# Altium integrated library SJ Sockets & Connectors.IntLib: 179 symbols (part 1 of 2)
Pins are listed as number, name and electrical type; pins without a type are passive.

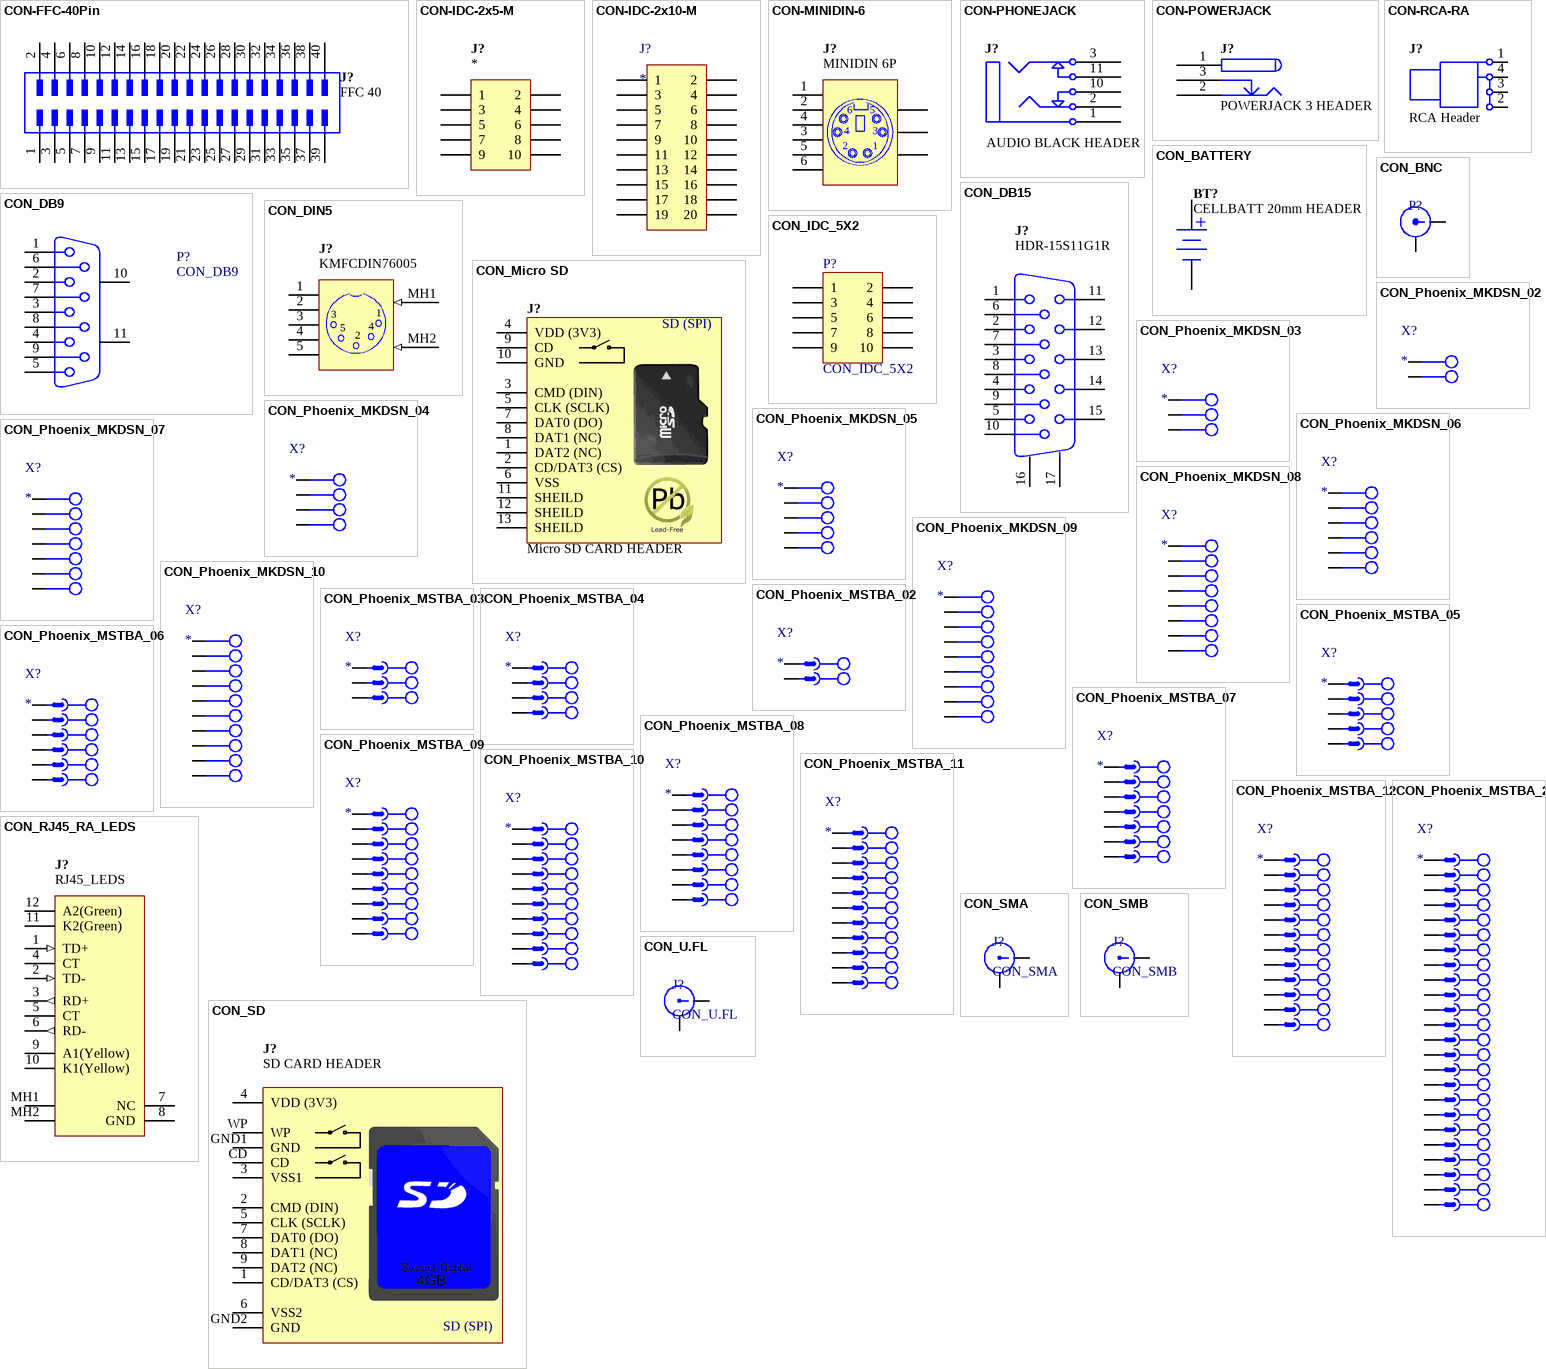
[diagram p0: symbols CON-FFC-40Pin to CON_U.FL]

## CON-FFC-40Pin
designator J?, comment FFC 40
Header FFC, 40 pin; Connector type: Straight; Max Current: mA; designer: Eng. Saeid Jorablo; Company: SJ Libraries; Mounting Technology: Surface Mount; Pin Count: 40; Status: Unreleased; Category: Connector; Publisher: SJ UnLimited; ComponentLink1Description: Datasheet; ComponentLink2Description: Reference; Update: 7/8/2012; HelpURL: http://s3.picofile.com/file/7443264187/Coming_Soon_logo.gif
footprint SMD_CON_FPC_2x20 (FPC-XXS1VN3R)
signal-integrity model Connector (40 Pin FFC Connector)
footprint FFC/SM0.5-2H40A (Connector; FH12 Series; 40 Position; 0.5mm Spaced Top Contact)
pins: 1, 2, 3, 4, 5, 6, 7, 8, 9, 10, 11, 12, 13, 14, 15, 16, 17, 18, 19, 20, 21, 22, 23, 24, 25, 26, 27, 28, 29, 30, 31, 32, 33, 34, 35, 36, 37, 38, 39, 40

## CON-IDC-2x5-M
designator J?
IDC, 2 X 5 Pin - Male; Connector type: Boxed; Max Current: mA; designer: Eng. Saeid Jorablo; Company: SJ Libraries; Category: Connector; Mounting Technology: Surface Mount; Pin Count: 10; Status: Unreleased; Publisher: SJ UnLimited; ComponentLink1Description: Datasheet; ComponentLink2Description: Reference; Update: 7/8/2012; HelpURL: http://s3.picofile.com/file/7443264187/Coming_Soon_logo.gif
footprint SMD_CON_IDC_2x5
signal-integrity model Connector (10 Pin IDC Connector)
footprint IDC2.54-V10D (Connector; IDC, Low Profile Male Header, Thru-Hole; 10 Position; Vertical; Pitch 2.54 mm; Body 20.32 x 9.2 x 9.45 mm (LxWxH))
footprint IDC2.54-H10C (Connector; IDC, Low Profile Male Header, Thru-Hole; 10 Position; Right Angle; Pitch 2.54 mm; Body 20.32 x 8.9 x 9.2 mm (LxWxH))
pins: 1, 2, 3, 4, 5, 6, 7, 8, 9, 10

## CON-IDC-2x10-M
designator J?
IDC, 2 X 10 Pin - Male; designer: Eng. Saeid Jorablo; Company: SJ Libraries; Max Current: mA; Mounting Technology: Through-Hole; Category: Connector; Pin Count: 20; Publisher: SJ UnLimited; Status: Unreleased; ComponentLink1Description: Datasheet; ComponentLink2Description: Reference; Update: 7/8/2012; HelpURL: http://s3.picofile.com/file/7443264187/Coming_Soon_logo.gif
footprint IDC2.54-H20C (Connector; IDC, Low Profile Male Header, Thru-Hole; 20 Position; Right Angle; Pitch 2.54 mm; Body 33.02 x 8.9 x 9.2 mm (LxWxH))
footprint IDC2.54-V20D (Connector; IDC, Low Profile Male Header, Thru-Hole; 20 Position; Vertical; Pitch 2.54 mm; Body 33.02 x 9.2 x 9.45 mm (LxWxH))
signal-integrity model Connector (20 Pin IDC Connector)
pins: 1, 2, 3, 4, 5, 6, 7, 8, 9, 10, 11, 12, 13, 14, 15, 16, 17, 18, 19, 20

## CON-MINIDIN-6
designator J?, comment MINIDIN 6P
MINI DIN R/A F/SHLD 6P GOLD PLATED; Black; Connector type: Right Angle; Max Current: 2A; designer: Eng. Saeid Jorablo; Company: SJ Libraries; Mounting Technology: Through-Hole; Pin Count: 6; Status: Unreleased; Category: Connector; Publisher: SJ UnLimited; ComponentLink1Description: Datasheet; ComponentLink2Description: Reference; Update: 7/8/2012; HelpURL: http://s3.picofile.com/file/7443264187/Coming_Soon_logo.gif
footprint DIP_CON_MINIDIN6_Keyboard (Footprint not found)
footprint DIP_CON_MINIDIN6_MOUSE
signal-integrity model Connector (mini DIN Connector)
pins: 1, 2, 3, 4, 5, 6, MH1 "Mounting Fixture", MH2 "Mounting Fixture", MH3 "Mounting Fixture"

## CON-PHONEJACK
designator J?, comment AUDIO BLACK HEADER
Connector, 3.5mm Stereo Audio Socket, Black, 2 break contacts (normals) and 2 auxiliary make contacts; Max Current: mA; designer: Eng. Saeid Jorablo; Company: SJ Libraries; Category: Connector; Connector type: AUDIO BLACK HEADER; Mounting Technology: Through-Hole; Pin Count: 5; Status: Unreleased; Publisher: SJ UnLimited; ComponentLink1Description: Datasheet; ComponentLink2Description: Reference; Update: 7/8/2012; HelpURL: http://s3.picofile.com/file/7443264187/Coming_Soon_logo.gif
footprint DIP_CON_TSH_3675_Headphone
footprint DIP_CON_TSH_3675_Line In
footprint DIP_CON_TSH_3675_Line Out
signal-integrity model Connector (Phone Jack Connector)
pins: 1, 2, 3, 10, 11
3 alternate drawings of the same symbol

## CON-POWERJACK
designator J?, comment POWERJACK 3 HEADER
Connector, 3 Conductor Power Jack 2 break 2 aux contacts; Max Current: mA; designer: Eng. Saeid Jorablo; Company: SJ Libraries; Category: Connector; Connector type: POWERJACK 3 HEADER; Mounting Technology: Through-Hole; Pin Count: 3; Status: Unreleased; Publisher: SJ UnLimited; ComponentLink1Description: Datasheet; ComponentLink2Description: Reference; Update: 7/8/2012; HelpURL: http://s3.picofile.com/file/7443264187/Coming_Soon_logo.gif
footprint DIP_CON_POWER JACK (Power Adaptor Jack)
signal-integrity model Connector (Power Jack Connector)
footprint DC Power Jack DS213 (DC Power Jack Model DS-213)
pins: 1 Core (power), 2 Shield (power), 3 Detect (power)
2 alternate drawings of the same symbol

## CON-RCA-RA
designator J?, comment RCA Header
Connector, TRC-005-4 , Black RCA Phono Jack, Right Angle, Thru-Hole, Snap-In; Max Current: mA; designer: Eng. Saeid Jorablo; Company: SJ Libraries; Connector type: Header; Mounting Technology: Through-Hole; Pin Count: 4; Status: Unreleased; Category: Connector; Publisher: SJ Limited; Update Date: 27-May-2012; Publisher: SJ UnLimited; ComponentLink1Description: Datasheet; ComponentLink2Description: Reference; Update: 7/8/2012; HelpURL: http://s3.picofile.com/file/7443264187/Coming_Soon_logo.gif
footprint DIP_CON_TRC
signal-integrity model Connector (RCA Connector)
pins: 1 Black, 2 Yellow, 3 White, 4 Red

## CON_BATTERY
designator BT?, comment CELLBATT 20mm HEADER
Lithium Battery Holder for CR2032 3V Cell; designer: Eng. Saeid Jorablo; Company: SJ Libraries; Max Current: mA; Category: Connector; Mounting Technology: Surface Mount\Through-Hole; Status: Unreleased; Pin Count: 2; Publisher: SJ UnLimited; ComponentLink1Description: Datasheet; ComponentLink2Description: Reference; Update: 7/8/2012; HelpURL: http://s3.picofile.com/file/7443264187/Coming_Soon_logo.gif
footprint CELL_HOLDER2
footprint cell_holder
footprint SMD_CELL_HOLDER
signal-integrity model Connector (Cell Holder Connector)
footprint SMD_CELL_HOLDER_BC501SM-TR (BC501SM-TR Battery Holder (For CR1220 Cells))
pins: 1 + (power), 2 - (power)
1 alternate drawing of the same symbol

## CON_BNC
designator P?
BNC Socket, PCB Mounted; designer: Eng. Saeid Jorablo; Company: SJ Libraries; Max Current: mA; Mounting Technology: Through-Hole; Category: Connector; Pin Count: 2; Publisher: SJ UnLimited; Status: Unreleased; ComponentLink1Description: Datasheet; ComponentLink2Description: Reference; Update: 7/8/2012; HelpURL: http://s3.picofile.com/file/7443264187/Coming_Soon_logo.gif
footprint BNC - Connector
footprint BNC - Complex
signal-integrity model Connector (BNC Connector)
pins: 1, 2

## CON_DB9
designator P?
Receptacle Assembly, 9 Position, Right Angle; Positions: 9; designer: Eng. Saeid Jorablo; Company: SJ Libraries; Max Current: mA; LatestRevisionDate: 17-Jul-2002; Publisher: SJ UnLimited; Orientation: Right Angle; Mounting Technology: Through-Hole; Category: Connector; Pin Count: 9; Status: Unreleased; ComponentLink1Description: Datasheet; ComponentLink2Description: Reference; Update: 7/8/2012; HelpURL: http://s3.picofile.com/file/7443264187/Coming_Soon_logo.gif
footprint DB9 Female (Connector; D Subminiature AMPLIMITE 2000; 9 Position; Right Angle)
footprint DB9 Male (Connector; D Subminiature AMPLIMITE 2000; 9 Position; Right Angle)
signal-integrity model Connector (DB9 Connector)
pins: 1 (Data Carrier Detect) DCD, 2 (Receive Data) RxD, 3 (Trasmit Data) TxD, 4 (Data Terminal Ready) DTR, 5 (Signal Ground) GND, 6 (Data Set Ready) DSR, 7 (Request To Send) RTS, 8 (Clear To Send) CTS, 9 (Ring Indicator) RI, 10, 11
2 alternate drawings of the same symbol

## CON_DB15
designator J?, comment HDR-15S11G1R
Socket, High-Density DB15 (HD15) R/A Female Through-hole; Connector type: Right Angle; Max Current: 3 A; designer: Eng. Saeid Jorablo; Company: SJ Libraries; Category: Connector; Mounting Technology: Through-Hole; Pin Count: 15; Status: Unreleased; Publisher: SJ UnLimited; ComponentLink1Description: Datasheet; ComponentLink2Description: Reference; Update: 7/8/2012; HelpURL: http://s3.picofile.com/file/7443264187/Coming_Soon_logo.gif
footprint DIP_CON_DB15_FEMALE
signal-integrity model Connector (DB15 Connector)
pins: 1 "Red Video", 2 "Green Video", 3 "Blue Video", 4 "Monitor ID Bit 2 (Ground)", 5 (power) "Ground", 6 (power) "Red Return (Ground)", 7 (power) "Green Return (Ground)", 8 (power) "Blue Return (Ground)", 9 "Key (not used)", 10 (power) "Sync Return (Ground)", 11 (power) "Monitor ID Bit 0 (Ground)", 12 "Monitor ID Bit 1 (Not Used)", 13 "Horizontal Zync", 14 "Vertical Sync", 15 "Vertical Sync", 16 MH1 "shield", 17 MH2 "shield"

## CON_DIN5
designator J?, comment KMFCDIN76005
Socket, 5-way R/A DIN; Connector type: Right Angle; Max Current: mA; designer: Eng. Saeid Jorablo; Company: SJ Libraries; Mounting Technology: Through-Hole; Pin Count: 5; Status: Unreleased; Category: Connector; Publisher: SJ UnLimited; ComponentLink1Description: Datasheet; ComponentLink2Description: Reference; Update: 7/8/2012; HelpURL: http://s3.picofile.com/file/7443264187/Coming_Soon_logo.gif
footprint DIP_CON_DIN5 (KMFCDIN76005)
signal-integrity model Connector (DIN Connector)
pins: 1, 2, 3, 4, 5, MH1 (in), MH2 (in)

## CON_IDC_5X2
designator P?
Header, 5-Pin, Dual row; designer: Eng. Saeid Jorablo; Company: SJ Libraries; Max Current: mA; LatestRevisionDate: 17-Jul-2002; Publisher: SJ UnLimited; Mounting Technology: Through-Hole; Category: Connector; Pin Count: 10; Status: Unreleased; ComponentLink1Description: Datasheet; ComponentLink2Description: Reference; Update: 7/8/2012; HelpURL: http://s3.picofile.com/file/7443264187/Coming_Soon_logo.gif
signal-integrity model Connector (10 Pin IDC Connector)
footprint IDC2.54-V10D (Connector; IDC, Low Profile Male Header, Thru-Hole; 10 Position; Vertical; Pitch 2.54 mm; Body 20.32 x 9.2 x 9.45 mm (LxWxH))
footprint IDC2.54-H10C (Connector; IDC, Low Profile Male Header, Thru-Hole; 10 Position; Right Angle; Pitch 2.54 mm; Body 20.32 x 8.9 x 9.2 mm (LxWxH))
pins: 1, 2, 3, 4, 5, 6, 7, 8, 9, 10

## CON_Micro SD
designator J?, comment Micro SD CARD HEADER
Secure Digital Card Socket; Max Current: mA; designer: Eng. Saeid Jorablo; Company: SJ Libraries; Connector type: Header; Mounting Technology: Surface Mount; Status: Unreleased; Category: Connector; Pin Count: 13; Publisher: SJ UnLimited; ComponentLink1Description: Datasheet; ComponentLink2Description: Reference; Update: 7/8/2012; HelpURL: http://s3.picofile.com/file/7443264187/Coming_Soon_logo.gif
signal-integrity model Connector (SD Card Connector)
footprint SMD_CON_Micro SD -Push-Push (Micro SD Socket, Push Push Type (Product Number:112J-TXAR-R ))
footprint Micro SD (MicroSD Socket (Molex 500873-080X) (3M 2908-05WB-MG))
pins: 1 DAT2 (NC), 2 CD/DAT3 (CS), 3 CMD (DIN), 4 VDD (3V3) (power), 5 CLK (SCLK), 6 VSS (power), 7 DAT0 (DO), 8 DAT1 (NC), 9 CD, 10 GND (power), 11 SHEILD (power), 12 SHEILD (power), 13 SHEILD (power)
text: SD (SPI)

## CON_Phoenix_MKDSN_02
designator X?
Manufacturer: PHOENIX CONTACT; Company: SJ Libraries; Connector type: PCB Terminal Block; designer: Eng. Saeid Jorablo; Max Current: 13.5 A; Positions: 2; Revision 1: 2012/10/1 : Adding Model; Voltage: 400 V; Category: Connector; ComponentLink1Description: Datasheet; ComponentLink2Description: Reference; HelpURL: http://s3.picofile.com/file/7443264187/Coming_Soon_logo.gif; Mounting Technology: Through-Hole; Pin Count: 2; Publisher: SJ UnLimited; Status: Unreleased; Update: 2012/10/1
footprint CON_MKDSN1,5/2-5,08
pins: 1, 2

## CON_Phoenix_MKDSN_03
designator X?
Manufacturer: PHOENIX CONTACT; Company: SJ Libraries; Connector type: PCB Terminal Block; designer: Eng. Saeid Jorablo; Max Current: 13.5 A; Positions: 3; Revision 1: 2012/10/1 : Adding Model; Voltage: 400 V; Category: Connector; ComponentLink1Description: Datasheet; ComponentLink2Description: Reference; HelpURL: http://s3.picofile.com/file/7443264187/Coming_Soon_logo.gif; Mounting Technology: Through-Hole; Pin Count: 3; Publisher: SJ UnLimited; Status: Unreleased; Update: 2012/10/1
footprint CON_MKDSN1,5/3-5,08
pins: 1, 2, 3

## CON_Phoenix_MKDSN_04
designator X?
Manufacturer: PHOENIX CONTACT; Company: SJ Libraries; Connector type: PCB Terminal Block; designer: Eng. Saeid Jorablo; Max Current: 13.5 A; Positions: 4; Revision 1: 2012/10/1 : Adding Model; Voltage: 400 V; Category: Connector; ComponentLink1Description: Datasheet; ComponentLink2Description: Reference; HelpURL: http://s3.picofile.com/file/7443264187/Coming_Soon_logo.gif; Mounting Technology: Through-Hole; Pin Count: 4; Publisher: SJ UnLimited; Status: Unreleased; Update: 2012/10/1
footprint CON_MKDSN1,5/4-5,08
pins: 1, 2, 3, 4

## CON_Phoenix_MKDSN_05
designator X?
Manufacturer: PHOENIX CONTACT; Company: SJ Libraries; Connector type: PCB Terminal Block; designer: Eng. Saeid Jorablo; Max Current: 13.5 A; Positions: 5; Revision 1: 2012/10/1 : Adding Model; Voltage: 400 V; Category: Connector; ComponentLink1Description: Datasheet; ComponentLink2Description: Reference; HelpURL: http://s3.picofile.com/file/7443264187/Coming_Soon_logo.gif; Mounting Technology: Through-Hole; Pin Count: 5; Publisher: SJ UnLimited; Status: Unreleased; Update: 2012/10/1
footprint CON_MKDSN1,5/5-5,08
pins: 1, 2, 3, 4, 5

## CON_Phoenix_MKDSN_06
designator X?
Manufacturer: PHOENIX CONTACT; Company: SJ Libraries; Connector type: PCB Terminal Block; designer: Eng. Saeid Jorablo; Max Current: 13.5 A; Positions: 6; Revision 1: 2012/10/1 : Adding Model; Voltage: 400 V; Category: Connector; ComponentLink1Description: Datasheet; ComponentLink2Description: Reference; HelpURL: http://s3.picofile.com/file/7443264187/Coming_Soon_logo.gif; Mounting Technology: Through-Hole; Pin Count: 6; Publisher: SJ UnLimited; Status: Unreleased; Update: 2012/10/1
footprint CON_MKDSN1,5/6-5,08
pins: 1, 2, 3, 4, 5, 6

## CON_Phoenix_MKDSN_07
designator X?
Manufacturer: PHOENIX CONTACT; Company: SJ Libraries; Connector type: PCB Terminal Block; designer: Eng. Saeid Jorablo; Max Current: 13.5 A; Positions: 7; Revision 1: 2012/10/1 : Adding Model; Voltage: 400 V; Category: Connector; ComponentLink1Description: Datasheet; ComponentLink2Description: Reference; HelpURL: http://s3.picofile.com/file/7443264187/Coming_Soon_logo.gif; Mounting Technology: Through-Hole; Pin Count: 7; Publisher: SJ UnLimited; Status: Unreleased; Update: 2012/10/1
footprint CON_MKDSN1,5/7-5,08
pins: 1, 2, 3, 4, 5, 6, 7

## CON_Phoenix_MKDSN_08
designator X?
Manufacturer: PHOENIX CONTACT; Company: SJ Libraries; Connector type: PCB Terminal Block; designer: Eng. Saeid Jorablo; Max Current: 13.5 A; Positions: 8; Revision 1: 2012/10/1 : Adding Model; Voltage: 400 V; Category: Connector; ComponentLink1Description: Datasheet; ComponentLink2Description: Reference; HelpURL: http://s3.picofile.com/file/7443264187/Coming_Soon_logo.gif; Mounting Technology: Through-Hole; Pin Count: 8; Publisher: SJ UnLimited; Status: Unreleased; Update: 2012/10/1
footprint CON_MKDSN1,5/8-5,08
pins: 1, 2, 3, 4, 5, 6, 7, 8

## CON_Phoenix_MKDSN_09
designator X?
Manufacturer: PHOENIX CONTACT; Company: SJ Libraries; Connector type: PCB Terminal Block; designer: Eng. Saeid Jorablo; Max Current: 13.5 A; Positions: 9; Revision 1: 2012/10/1 : Adding Model; Voltage: 400 V; Category: Connector; ComponentLink1Description: Datasheet; ComponentLink2Description: Reference; HelpURL: http://s3.picofile.com/file/7443264187/Coming_Soon_logo.gif; Mounting Technology: Through-Hole; Pin Count: 9; Publisher: SJ UnLimited; Status: Unreleased; Update: 2012/10/1
footprint CON_MKDSN1,5/9-5,08
pins: 1, 2, 3, 4, 5, 6, 7, 8, 9

## CON_Phoenix_MKDSN_10
designator X?
Manufacturer: PHOENIX CONTACT; Company: SJ Libraries; Connector type: PCB Terminal Block; designer: Eng. Saeid Jorablo; Max Current: 13.5 A; Positions: 10; Revision 1: 2012/10/1 : Adding Model; Voltage: 400 V; Category: Connector; ComponentLink1Description: Datasheet; ComponentLink2Description: Reference; HelpURL: http://s3.picofile.com/file/7443264187/Coming_Soon_logo.gif; Mounting Technology: Through-Hole; Pin Count: 10; Publisher: SJ UnLimited; Status: Unreleased; Update: 2012/10/1
footprint CON_MKDSN1,5/10-5,08
pins: 1, 2, 3, 4, 5, 6, 7, 8, 9, 10

## CON_Phoenix_MSTBA_02
designator X?
Manufacturer: PHOENIX CONTACT; Company: SJ Libraries; Connector type: PCB Terminal Block; designer: Eng. Saeid Jorablo; Max Current: 12 A; Positions: 2; Revision 1: 2012/10/1 : Adding Model; Voltage: 320 V; Category: Connector; ComponentLink1Description: Datasheet; ComponentLink2Description: Reference; HelpURL: http://s3.picofile.com/file/7443264187/Coming_Soon_logo.gif; Mounting Technology: Through-Hole; Pin Count: 2; Publisher: SJ UnLimited; Status: Unreleased; Update: 2012/10/1
footprint CON_MSTBA02
pins: 1, 2

## CON_Phoenix_MSTBA_03
designator X?
Manufacturer: PHOENIX CONTACT; Company: SJ Libraries; Connector type: PCB Terminal Block; designer: Eng. Saeid Jorablo; Max Current: 12 A; Positions: 3; Revision 1: 2012/10/1 : Adding Model; Voltage: 320 V; Category: Connector; ComponentLink1Description: Datasheet; ComponentLink2Description: Reference; HelpURL: http://s3.picofile.com/file/7443264187/Coming_Soon_logo.gif; Mounting Technology: Through-Hole; Pin Count: 3; Publisher: SJ UnLimited; Status: Unreleased; Update: 2012/10/1
footprint CON_MSTBA03
pins: 1, 2, 3

## CON_Phoenix_MSTBA_04
designator X?
Manufacturer: PHOENIX CONTACT; Company: SJ Libraries; Connector type: PCB Terminal Block; designer: Eng. Saeid Jorablo; Max Current: 12 A; Positions: 4; Revision 1: 2012/10/1 : Adding Model; Voltage: 320 V; Category: Connector; ComponentLink1Description: Datasheet; ComponentLink2Description: Reference; HelpURL: http://s3.picofile.com/file/7443264187/Coming_Soon_logo.gif; Mounting Technology: Through-Hole; Pin Count: 4; Publisher: SJ UnLimited; Status: Unreleased; Update: 2012/10/1
footprint CON_MSTBA04
pins: 1, 2, 3, 4

## CON_Phoenix_MSTBA_05
designator X?
Manufacturer: PHOENIX CONTACT; Company: SJ Libraries; Connector type: PCB Terminal Block; designer: Eng. Saeid Jorablo; Max Current: 12 A; Positions: 5; Revision 1: 2012/10/1 : Adding Model; Voltage: 320 V; Category: Connector; ComponentLink1Description: Datasheet; ComponentLink2Description: Reference; HelpURL: http://s3.picofile.com/file/7443264187/Coming_Soon_logo.gif; Mounting Technology: Through-Hole; Pin Count: 5; Publisher: SJ UnLimited; Status: Unreleased; Update: 2012/10/1
footprint CON_MSTBA05
pins: 1, 2, 3, 4, 5

## CON_Phoenix_MSTBA_06
designator X?
Manufacturer: PHOENIX CONTACT; Company: SJ Libraries; Connector type: PCB Terminal Block; designer: Eng. Saeid Jorablo; Max Current: 12 A; Positions: 6; Revision 1: 2012/10/1 : Adding Model; Voltage: 320 V; Category: Connector; ComponentLink1Description: Datasheet; ComponentLink2Description: Reference; HelpURL: http://s3.picofile.com/file/7443264187/Coming_Soon_logo.gif; Mounting Technology: Through-Hole; Pin Count: 6; Publisher: SJ UnLimited; Status: Unreleased; Update: 2012/10/1
footprint CON_MSTBA06
pins: 1, 2, 3, 4, 5, 6

## CON_Phoenix_MSTBA_07
designator X?
Manufacturer: PHOENIX CONTACT; Company: SJ Libraries; Connector type: PCB Terminal Block; designer: Eng. Saeid Jorablo; Max Current: 12 A; Positions: 7; Revision 1: 2012/10/1 : Adding Model; Voltage: 320 V; Category: Connector; ComponentLink1Description: Datasheet; ComponentLink2Description: Reference; HelpURL: http://s3.picofile.com/file/7443264187/Coming_Soon_logo.gif; Mounting Technology: Through-Hole; Pin Count: 7; Publisher: SJ UnLimited; Status: Unreleased; Update: 2012/10/1
footprint CON_MSTBA07
pins: 1, 2, 3, 4, 5, 6, 7

## CON_Phoenix_MSTBA_08
designator X?
Manufacturer: PHOENIX CONTACT; Company: SJ Libraries; Connector type: PCB Terminal Block; designer: Eng. Saeid Jorablo; Max Current: 12 A; Positions: 8; Revision 1: 2012/10/1 : Adding Model; Voltage: 320 V; Category: Connector; ComponentLink1Description: Datasheet; ComponentLink2Description: Reference; HelpURL: http://s3.picofile.com/file/7443264187/Coming_Soon_logo.gif; Mounting Technology: Through-Hole; Pin Count: 8; Publisher: SJ UnLimited; Status: Unreleased; Update: 2012/10/1
footprint CON_MSTBA08
pins: 1, 2, 3, 4, 5, 6, 7, 8

## CON_Phoenix_MSTBA_09
designator X?
Manufacturer: PHOENIX CONTACT; Company: SJ Libraries; Connector type: PCB Terminal Block; designer: Eng. Saeid Jorablo; Max Current: 12 A; Positions: 9; Revision 1: 2012/10/1 : Adding Model; Voltage: 320 V; Category: Connector; ComponentLink1Description: Datasheet; ComponentLink2Description: Reference; HelpURL: http://s3.picofile.com/file/7443264187/Coming_Soon_logo.gif; Mounting Technology: Through-Hole; Pin Count: 9; Publisher: SJ UnLimited; Status: Unreleased; Update: 2012/10/1
footprint CON_MSTBA09
pins: 1, 2, 3, 4, 5, 6, 7, 8, 9

## CON_Phoenix_MSTBA_10
designator X?
Manufacturer: PHOENIX CONTACT; Company: SJ Libraries; Connector type: PCB Terminal Block; designer: Eng. Saeid Jorablo; Max Current: 12 A; Positions: 10; Revision 1: 2012/10/1 : Adding Model; Voltage: 320 V; Category: Connector; ComponentLink1Description: Datasheet; ComponentLink2Description: Reference; HelpURL: http://s3.picofile.com/file/7443264187/Coming_Soon_logo.gif; Mounting Technology: Through-Hole; Pin Count: 10; Publisher: SJ UnLimited; Status: Unreleased; Update: 2012/10/1
footprint CON_MSTBA10
pins: 1, 2, 3, 4, 5, 6, 7, 8, 9, 10

## CON_Phoenix_MSTBA_11
designator X?
Manufacturer: PHOENIX CONTACT; Company: SJ Libraries; Connector type: PCB Terminal Block; designer: Eng. Saeid Jorablo; Max Current: 12 A; Positions: 11; Revision 1: 2012/10/1 : Adding Model; Voltage: 320 V; Category: Connector; ComponentLink1Description: Datasheet; ComponentLink2Description: Reference; HelpURL: http://s3.picofile.com/file/7443264187/Coming_Soon_logo.gif; Mounting Technology: Through-Hole; Pin Count: 11; Publisher: SJ UnLimited; Status: Unreleased; Update: 2012/10/1
footprint CON_MSTBA11
pins: 1, 2, 3, 4, 5, 6, 7, 8, 9, 10, 11

## CON_Phoenix_MSTBA_12
designator X?
Manufacturer: PHOENIX CONTACT; Company: SJ Libraries; Connector type: PCB Terminal Block; designer: Eng. Saeid Jorablo; Max Current: 12 A; Positions: 12; Revision 1: 2012/10/1 : Adding Model; Voltage: 320 V; Category: Connector; ComponentLink1Description: Datasheet; ComponentLink2Description: Reference; HelpURL: http://s3.picofile.com/file/7443264187/Coming_Soon_logo.gif; Mounting Technology: Through-Hole; Pin Count: 12; Publisher: SJ UnLimited; Status: Unreleased; Update: 2012/10/1
footprint CON_MSTBA12
pins: 1, 2, 3, 4, 5, 6, 7, 8, 9, 10, 11, 12

## CON_Phoenix_MSTBA_24
designator X?
Manufacturer: PHOENIX CONTACT; Company: SJ Libraries; Connector type: PCB Terminal Block; designer: Eng. Saeid Jorablo; Max Current: 12 A; Positions: 24; Revision 1: 2012/10/1 : Adding Model; Voltage: 320 V; Category: Connector; ComponentLink1Description: Datasheet; ComponentLink2Description: Reference; HelpURL: http://s3.picofile.com/file/7443264187/Coming_Soon_logo.gif; Mounting Technology: Through-Hole; Pin Count: 24; Publisher: SJ UnLimited; Status: Unreleased; Update: 2012/10/1
footprint CON_MSTBA24
pins: 1, 2, 3, 4, 5, 6, 7, 8, 9, 10, 11, 12, 13, 14, 15, 16, 17, 18, 19, 20, 21, 22, 23, 24

## CON_RJ45_RA_LEDS
designator J?, comment RJ45_LEDS
Socket, 1x1 Tab-DOWN R/A 8-Way RJ45; Connector type: Right Angle; Max Current: mA; designer: Eng. Saeid Jorablo; Company: SJ Libraries; Mounting Technology: Through-Hole; Pin Count: 12; Status: Unreleased; Category: Connector; Publisher: SJ UnLimited; ComponentLink1Description: Datasheet; ComponentLink2Description: Reference; Update: 7/8/2012; HelpURL: http://s3.picofile.com/file/7443264187/Coming_Soon_logo.gif
footprint DIP_CON_RJ45_RA_LEDS
signal-integrity model Connector (RJ45 Connector)
footprint DIP_CON_RJ45_RA_LEDS2 (HR911105A Connector)
pins: 1 TD+ (in), 2 TD- (in), 3 RD+ (out), 4 CT (power), 5 CT (power), 6 RD- (out), 7 NC, 8 GND (power), 9 A1(Yellow), 10 K1(Yellow), 11 K2(Green), 12 A2(Green), MH1 (power), MH2 (power)
1 alternate drawing of the same symbol

## CON_SD
designator J?, comment SD CARD HEADER
Secure Digital Card Socket; Max Current: mA; designer: Eng. Saeid Jorablo; Company: SJ Libraries; Connector type: Header; Mounting Technology: Surface Mount; Status: Unreleased; Category: Connector; Pin Count: 13; Publisher: SJ UnLimited; ComponentLink1Description: Datasheet; ComponentLink2Description: Reference; Update: 7/8/2012; HelpURL: http://s3.picofile.com/file/7443264187/Coming_Soon_logo.gif
footprint SMD_SOCKET_SD (KSDC012551)
footprint SMD_SOCKET_MMC
signal-integrity model Connector (SD Card Connector)
pins: 1 CD/DAT3 (CS), 2 CMD (DIN), 3 VSS1 (power), 4 VDD (3V3) (power), 5 CLK (SCLK), 6 VSS2 (power), 7 DAT0 (DO), 8 DAT1 (NC), 9 DAT2 (NC), CD, GND1 GND (power), GND2 GND (power), WP
text: SD (SPI)

## CON_SMA
designator J?
SMA High Frequency Conector; designer: Eng. Saeid Jorablo; Company: SJ Libraries; Max Current: mA; Mounting Technology: Through-Hole; Category: Connector; Pin Count: 2; Publisher: SJ UnLimited; Status: Unreleased; ComponentLink1Description: Datasheet; ComponentLink2Description: Reference; Update: 7/8/2012; HelpURL: http://s3.picofile.com/file/7443264187/Coming_Soon_logo.gif
footprint DIP_CON_SMA-Vertical
signal-integrity model Connector (HF SMA Connector)
pins: 1, 2

## CON_SMB
designator J?
SMB High Frequency Conector; designer: Eng. Saeid Jorablo; Company: SJ Libraries; Max Current: mA; Mounting Technology: Through-Hole; Category: Connector; Pin Count: 2; Publisher: SJ UnLimited; Status: Unreleased; ComponentLink1Description: Datasheet; ComponentLink2Description: Reference; Update: 7/8/2012; HelpURL: http://s3.picofile.com/file/7443264187/Coming_Soon_logo.gif
footprint DIP_CON_SMB-Vertical
signal-integrity model Connector (HF SMB Connector)
pins: 1, 2

## CON_U.FL
designator J?
U.FL High Frequency SMD Conector; designer: Eng. Saeid Jorablo; Company: SJ Libraries; Connector type: RF; Max Current: mA; Mounting Technology: Surface Mount; Category: Connector; Pin Count: 2; Publisher: SJ UnLimited; Status: Unreleased; ComponentLink1Description: Datasheet; ComponentLink1URL: http://www.te.com/commerce/DocumentDelivery/DDEController?Action=srchrtrv&DocNm=1566230&DocType=CD&DocLang=EN; ComponentLink2Description: Reference; ComponentLink2URL: http://www.te.com/catalog/connectors/rf-coax-connector/menu/en/17635?BML=10576,17560; Update: 7/8/2012; HelpURL: http://s3.picofile.com/file/7443264187/Coming_Soon_logo.gif; Supplier 1: Digi-Key; Supplier Part Number 1: A36237CT-ND
signal-integrity model Connector (HF SMA Connector)
footprint SMD_U.FL-R-SMT-1
pins: 1, 2

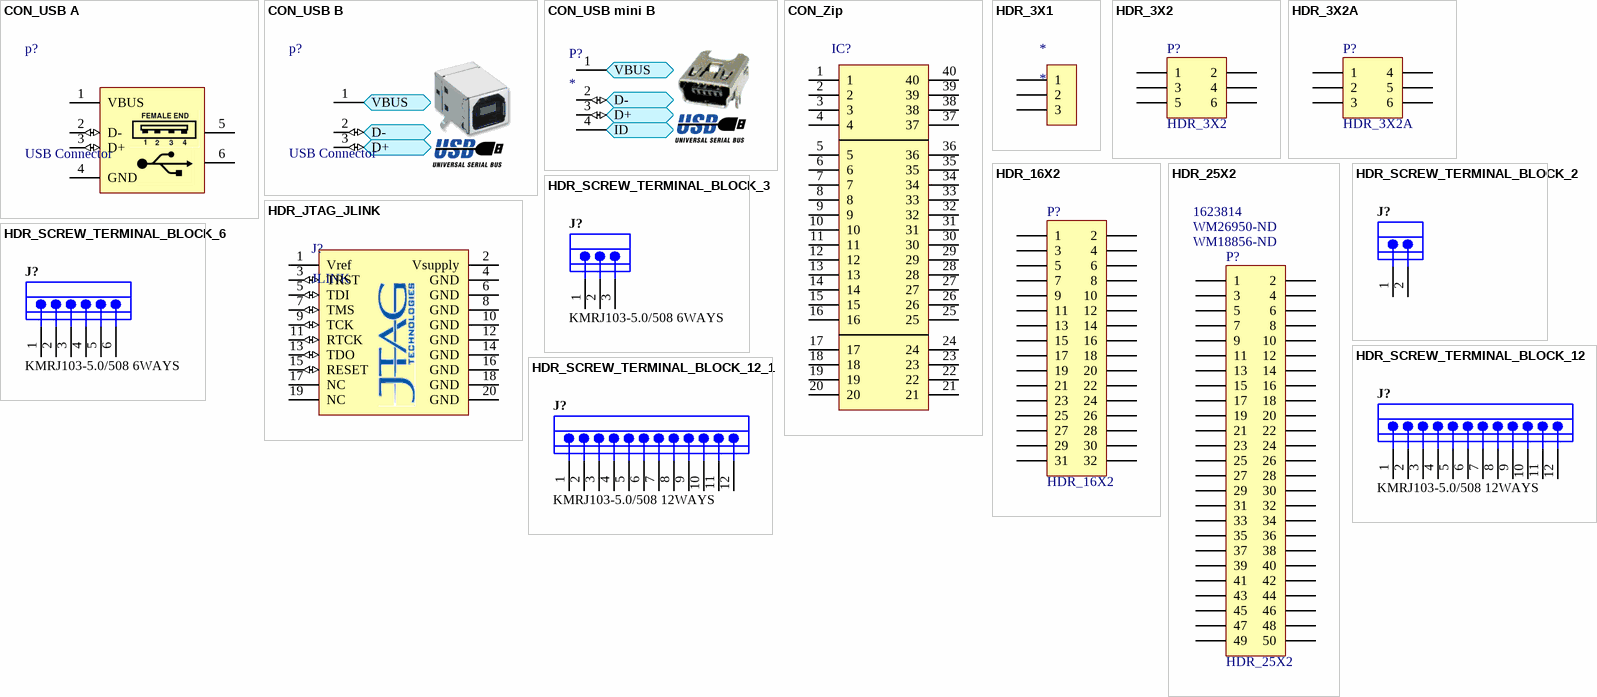
[diagram p1: symbols CON_USB A to HDR_SCREW_TERMINAL_BLOCK_12_1]

## CON_USB A
designator p?, comment USB Connector
USB Connector-B Type; Designer: Eng. Saeid Jorablo; Company: SJ Libraries; Max Current: mA; Mounting Technology: Surface Mount\Through-Hole; Category: Connector; Pin Count: 4; Publisher: SJ UnLimited; Status: Unreleased; ComponentLink1Description: Datasheet; ComponentLink2Description: Reference; Update: 7/8/2012; HelpURL: http://s3.picofile.com/file/7443264187/Coming_Soon_logo.gif
signal-integrity model Connector (USB B Type Connector)
footprint USB2.5-2H4C (Connector; USB1.1, Type A, Thru-Hole; 4 Position; Right Angle)
footprint USB2.5-2V4A (Connector; USB1.1, Type A, Thru-Hole; 4 Position; Vertical)
footprint USB/SM2.5-4H4 (Connector; USB1.1, Type A, SM; 4 Position; Right Angle)
footprint USB/SM2.5-4H4A (Connector; USB1.1, Type A, SM; 4 Position; Right Angle)
footprint USB2.0-4H4 (Connector; USB1.1, Type A, Thru-Hole; 4 Position; Right Angle)
pins: 1 VBUS (power), 2 D- (io), 3 D+ (io), 4 GND (power), 5 MH (power), 6 MH (power)
3 alternate drawings of the same symbol

## CON_USB B
designator p?, comment USB Connector
USB Connector-B Type; Designer: Eng. Saeid Jorablo; Company: SJ Libraries; Max Current: mA; Mounting Technology: Surface Mount\Through-Hole; Category: Connector; Pin Count: 4; Publisher: SJ UnLimited; Status: Unreleased; ComponentLink1Description: Datasheet; ComponentLink2Description: Reference; Update: 7/8/2012; HelpURL: http://s3.picofile.com/file/7443264187/Coming_Soon_logo.gif
footprint USB2.5-2H4D (Connector; USB1.1, Type B, Thru-Hole; 4 Position; Right Angle)
footprint USB2.5-2H4E (Connector; USB1.1, Type B, Thru-Hole; 4 Position; Right Angle)
footprint USB2.5-2H4F (Connector; USB1.1, Type B, Thru-Hole; 4 Position; Right Angle)
footprint USB2.5-2H4G (Connector; USB1.1, Type B, Thru-Hole; 4 Position; Right Angle)
footprint USB2.5-2V4 (Connector; USB1.1, Type B, Thru-Hole; 4 Position; Vertical)
footprint USB2.5-4V4 (Connector; USB1.1, Type B, Thru-Hole; 4 Position; Vertical)
footprint USB/SM1.25-4H4 (Connector; USB1.1, Type B, SM; 4 Position; Right Angle)
signal-integrity model Connector (USB B Type Connector)
pins: 1 VBUS (power), 2 D- (io), 3 D+ (io), 4 GND (power) hidden to DGND, 5 MH (power) hidden to DGND, 6 MH (power) hidden to DGND
1 alternate drawing of the same symbol

## CON_USB mini B
designator P?
mini USB Connector; designer: Eng. Saeid Jorablo; Company: SJ Libraries; Max Current: mA; Mounting Technology: Surface Mount\Through-Hole; Category: Connector; Pin Count: 5; Publisher: SJ UnLimited; Status: Unreleased; ComponentLink1Description: Datasheet; ComponentLink2Description: Reference; Update: 7/8/2012; HelpURL: http://s3.picofile.com/file/7443264187/Coming_Soon_logo.gif
footprint mini USB Connector
footprint SMD_Mini USB Connector
footprint USB/SM0.8-6H5 (Connector; USB2.0, Type B, SM; 5 Position; Right Angle)
signal-integrity model Connector (mini USB B Type Connector)
pins: 1 VBUS (power), 2 D- (io), 3 D+ (io), 4 ID, 5 GND (power) hidden to GND, 6 MH (power) hidden to GND, 7 MH (power) hidden to GND, 8 MH (power) hidden to GND, 9 MH (power) hidden to GND
1 alternate drawing of the same symbol

## CON_Zip
designator IC?  (value not drawn)
40pin Zip/Zif Socket; Company: SJ Libraries; designer: Eng. Saeid Jorablo; Max Current: mA; Mounting Technology: Through-Hole; Category: Connector; Pin Count: 40; Publisher: SJ UnLimited; Status: Unreleased; ComponentLink1Description: Datasheet; ComponentLink2Description: Reference; Update: 7/8/2012; HelpURL: http://s3.picofile.com/file/7443264187/Coming_Soon_logo.gif
footprint DIP40 - Zip Socket
signal-integrity model Connector (40 Pin Connector)
pins: 1, 2, 3, 4, 5, 6, 7, 8, 9, 10, 11, 12, 13, 14, 15, 16, 17, 18, 19, 20, 21, 22, 23, 24, 25, 26, 27, 28, 29, 30, 31, 32, 33, 34, 35, 36, 37, 38, 39, 40

## HDR_3X1
designator *
footprint HEADER 3X1
signal-integrity model Header
pins: 1, 2, 3

## HDR_3X2
designator P?
Header, 3-Pin, Dual row; designer: Eng. Saeid Jorablo; Company: SJ Libraries; Max Current: mA; LatestRevisionDate: 17-Jul-2002; Publisher: SJ UnLimited; Mounting Technology: Through-Hole; Category: Headers; Pin Count: 6; Status: Unreleased; ComponentLink1Description: Datasheet; ComponentLink2Description: Reference; Update: 7/8/2012; HelpURL: http://s3.picofile.com/file/7443264187/Coming_Soon_logo.gif
footprint MISC_HDR_2X3 (Footprint not found)
signal-integrity model Connector (6 Pin Connector)
footprint MISC_HDR_2X3H (Connector; Header; 3x2 Position; Right Angle)
pins: 1, 2, 3, 4, 5, 6

## HDR_3X2A
designator P?
Header, 3-Pin, Dual row; designer: Eng. Saeid Jorablo; Company: SJ Libraries; Max Current: mA; LatestRevisionDate: 17-Jul-2002; Publisher: SJ UnLimited; Mounting Technology: Through-Hole; Category: Headers; Pin Count: 6; Status: Unreleased; ComponentLink1Description: Datasheet; ComponentLink2Description: Reference; Update: 7/8/2012; HelpURL: http://s3.picofile.com/file/7443264187/Coming_Soon_logo.gif
footprint MISC_HDR_2X3_CEN (Connector; Header; 3x2 Position)
signal-integrity model Connector (6 Pin Connector)
pins: 1, 2, 3, 4, 5, 6

## HDR_16X2
designator P?
Header, 16-Pin, Dual row; Manufacturer: Molex; Company: SJ Libraries; designer: Eng. Saeid Jorablo; Max Current: 2A; Positions: 2x16; Revision 1: 7/8/2012: Create Model; Category: Headers; ComponentLink1Description: Datasheet; ComponentLink2Description: Reference; Connector type: Header; Mounting Technology: Through-Hole; Orientation: Vertical/Right Angle; Pin Count: 32; Publisher: SJ UnLimited; Status: Unreleased; Update: 7/8/2012; HelpURL: http://s3.picofile.com/file/7443264187/Coming_Soon_logo.gif
footprint HDR2X16-2.54mm (Connector; Header; 16x2 Position; 2.54mm Pitch)
signal-integrity model Connector
footprint HDR2X16h-2.54mm (Connector; Header; 16x2 Position; Right Angle; 2.54mm Pitch)
footprint HDR2X16-2mm (Connector; Header; 16x2 Position; 2mm Pitch)
footprint HDR2X16h-2mm (Connector; Header; 16x2 Position; Right Angle; 2mm Pitch)
pins: 1, 2, 3, 4, 5, 6, 7, 8, 9, 10, 11, 12, 13, 14, 15, 16, 17, 18, 19, 20, 21, 22, 23, 24, 25, 26, 27, 28, 29, 30, 31, 32

## HDR_25X2
designator P?  Supplier Part Number 1: WM18856-ND  Supplier Part Number 2: WM26950-ND  Supplier Part Number 3: 1623814
Header, 25-Pin, Dual row; Manufacturer: Molex; Company: SJ Libraries; designer: Eng. Saeid Jorablo; Max Current: 2A; Positions: 2x25; Revision 1: 7/8/2012: Create Model; Category: Headers; ComponentLink1Description: Datasheet; ComponentLink2Description: Reference; Connector type: Header; Mounting Technology: Through-Hole; Pin Count: 50; Publisher: SJ UnLimited; Status: Unreleased; Update: 7/8/2012; Supplier 1: Digi-Key; Supplier 2: Digi-Key; Supplier 3: Farnell; HelpURL: http://s3.picofile.com/file/7443264187/Coming_Soon_logo.gif
footprint HDR2X25-2mm (Connector; Header; 25x2 Position; 2mm Pitch)
signal-integrity model Connector
footprint HDR2X25-2.54mm (Connector; Header; 25x2 Position; 2.54 mm Pitch)
footprint HDR2X25H-2mm (Connector; Header; 25x2 Position; Right Angle; 2 mm Pitch)
footprint HDR2X25H-2.54mm (Connector; Header; 25x2 Position; Right Angle;2.54mm Pitch)
pins: 1, 2, 3, 4, 5, 6, 7, 8, 9, 10, 11, 12, 13, 14, 15, 16, 17, 18, 19, 20, 21, 22, 23, 24, 25, 26, 27, 28, 29, 30, 31, 32, 33, 34, 35, 36, 37, 38, 39, 40, 41, 42, 43, 44, 45, 46, 47, 48, 49, 50

## HDR_JTAG_JLINK
designator J?, comment JLINK
20 Pin Standard JTAG Header For ARM JLINK; Company: SJ Libraries; Connector type: IDC2.54-20; designer: Eng. Saeid Jorablo; Max Current: mA; Positions: 20; Revision 1: 7/8/2012: Create Model; Category: Headers; ComponentLink1Description: Datasheet; ComponentLink2Description: Reference; Mounting Technology: Through-Hole; Orientation: Vertical; Pin Count: 20; Publisher: SJ UnLimited; Status: Unreleased; Update: 7/8/2012; HelpURL: http://s3.picofile.com/file/7443264187/Coming_Soon_logo.gif
footprint IDC2.54-V20D (Connector; IDC, Low Profile Male Header, Thru-Hole; 20 Position; Vertical; Pitch 2.54 mm; Body 33.02 x 9.2 x 9.45 mm (LxWxH))
pins: 1 Vref (power), 2 Vsupply (power), 3 TRST (io), 4 GND (power), 5 TDI (io), 6 GND (power), 7 TMS (io), 8 GND (power), 9 TCK (io), 10 GND (power), 11 RTCK (io), 12 GND (power), 13 TDO (io), 14 GND (power), 15 RESET (io), 16 GND (power), 17 NC, 18 GND (power), 19 NC, 20 GND (power)

## HDR_SCREW_TERMINAL_BLOCK_2
designator J?
Connector type: Header; Max Current: 300V/10A A; designer: Eng. Saeid Jorablo; Company: SJ Libraries; Mounting Technology: Through-Hole; Pin Count: 12; Status: Unreleased; Category: Headers; Publisher: SJ UnLimited; Supplier 1: Digi-Key; ComponentLink1Description: Datasheet; ComponentLink2Description: Reference; Update: 7/8/2012; Supplier Part Number 1: 1776257-2-ND; HelpURL: http://s3.picofile.com/file/7443264187/Coming_Soon_logo.gif
footprint Socket Blue 2
footprint SOCKET 2 - Right Angle
signal-integrity model Socket2 (socket 2 Pin)
pins: 1, 2

## HDR_SCREW_TERMINAL_BLOCK_3
designator J?, comment KMRJ103-5.0/508 6WAYS
Socket, Screw Terminal Block, 3 Way, 0.1inmm pitch, 90 degree angle, Through-hole; Connector type: Header; Max Current: 300V/10A A; designer: Eng. Saeid Jorablo; Company: SJ Libraries; Mounting Technology: Through-Hole; Pin Count: 3; Status: Unreleased; Category: Headers; Publisher: SJ UnLimited; Supplier 1: Digi-Key; ComponentLink1Description: Datasheet; ComponentLink2Description: Reference; Update: 7/8/2012; Supplier Part Number 1: 1776257-3-ND; HelpURL: http://s3.picofile.com/file/7443264187/Coming_Soon_logo.gif
footprint Socket Blue 3
footprint SOCKET 3 - RIGHT ANGLE
signal-integrity model Socket3 (Socket 3 Pin)
pins: 1, 2, 3

## HDR_SCREW_TERMINAL_BLOCK_6
designator J?, comment KMRJ103-5.0/508 6WAYS
Socket, Screw Terminal Block, 6 Way, 5.0mm pitch, 45 degree angle, Through-hole; Connector type: Header; Max Current: 300V/10A A; designer: Eng. Saeid Jorablo; Company: SJ Libraries; Mounting Technology: Through-Hole; Pin Count: 6; Status: Unreleased; Category: Headers; Publisher: SJ UnLimited; Supplier 1: Digi-Key; ComponentLink1Description: Datasheet; ComponentLink2Description: Reference; Update: 7/8/2012; Supplier Part Number 1: 1776257-6-ND; HelpURL: http://s3.picofile.com/file/7443264187/Coming_Soon_logo.gif
footprint DIP_HDR_SCREW_6 (KMRJ103-5-508-6)
signal-integrity model Socket6 (Socket 6 Pin)
footprint socket blue 6
pins: 1, 2, 3, 4, 5, 6

## HDR_SCREW_TERMINAL_BLOCK_12
designator J?, comment KMRJ103-5.0/508 12WAYS
Socket, Screw Terminal Block, 12 Way, 5.0mm pitch, 45 degree angle, Through-hole; Connector type: Header; Max Current: 300V/10A A; designer: Eng. Saeid Jorablo; Company: SJ Libraries; Mounting Technology: Through-Hole; Pin Count: 12; Status: Unreleased; Category: Headers; Publisher: SJ UnLimited; Supplier 1: Digi-Key; ComponentLink1Description: Datasheet; ComponentLink2Description: Reference; Update: 7/8/2012; Supplier Part Number 1: 1-1776258-2-ND; HelpURL: http://s3.picofile.com/file/7443264187/Coming_Soon_logo.gif
footprint DIP_HDR_SCREW_12 (KMRJ103-5-508-12)
signal-integrity model Socket12 (Socket 12 Pin)
pins: 1, 2, 3, 4, 5, 6, 7, 8, 9, 10, 11, 12

## HDR_SCREW_TERMINAL_BLOCK_12_1
designator J?, comment KMRJ103-5.0/508 12WAYS
Socket, Screw Terminal Block, 12 Way, 5.0mm pitch, 45 degree angle, Through-hole; Connector type: Header; Max Current: 300V/10A A; designer: Eng. Saeid Jorablo; Company: SJ Libraries; Mounting Technology: Through-Hole; Pin Count: 12; Status: Unreleased; Category: Headers; Publisher: SJ UnLimited; Supplier 1: Digi-Key; ComponentLink1Description: Datasheet; ComponentLink2Description: Reference; Update: 7/8/2012; Supplier Part Number 1: 1-1776258-2-ND; HelpURL: http://s3.picofile.com/file/7443264187/Coming_Soon_logo.gif
footprint DIP_HDR_SCREW_12 (KMRJ103-5-508-12)
signal-integrity model Socket12 (Socket 12 Pin)
pins: 1, 2, 3, 4, 5, 6, 7, 8, 9, 10, 11, 12


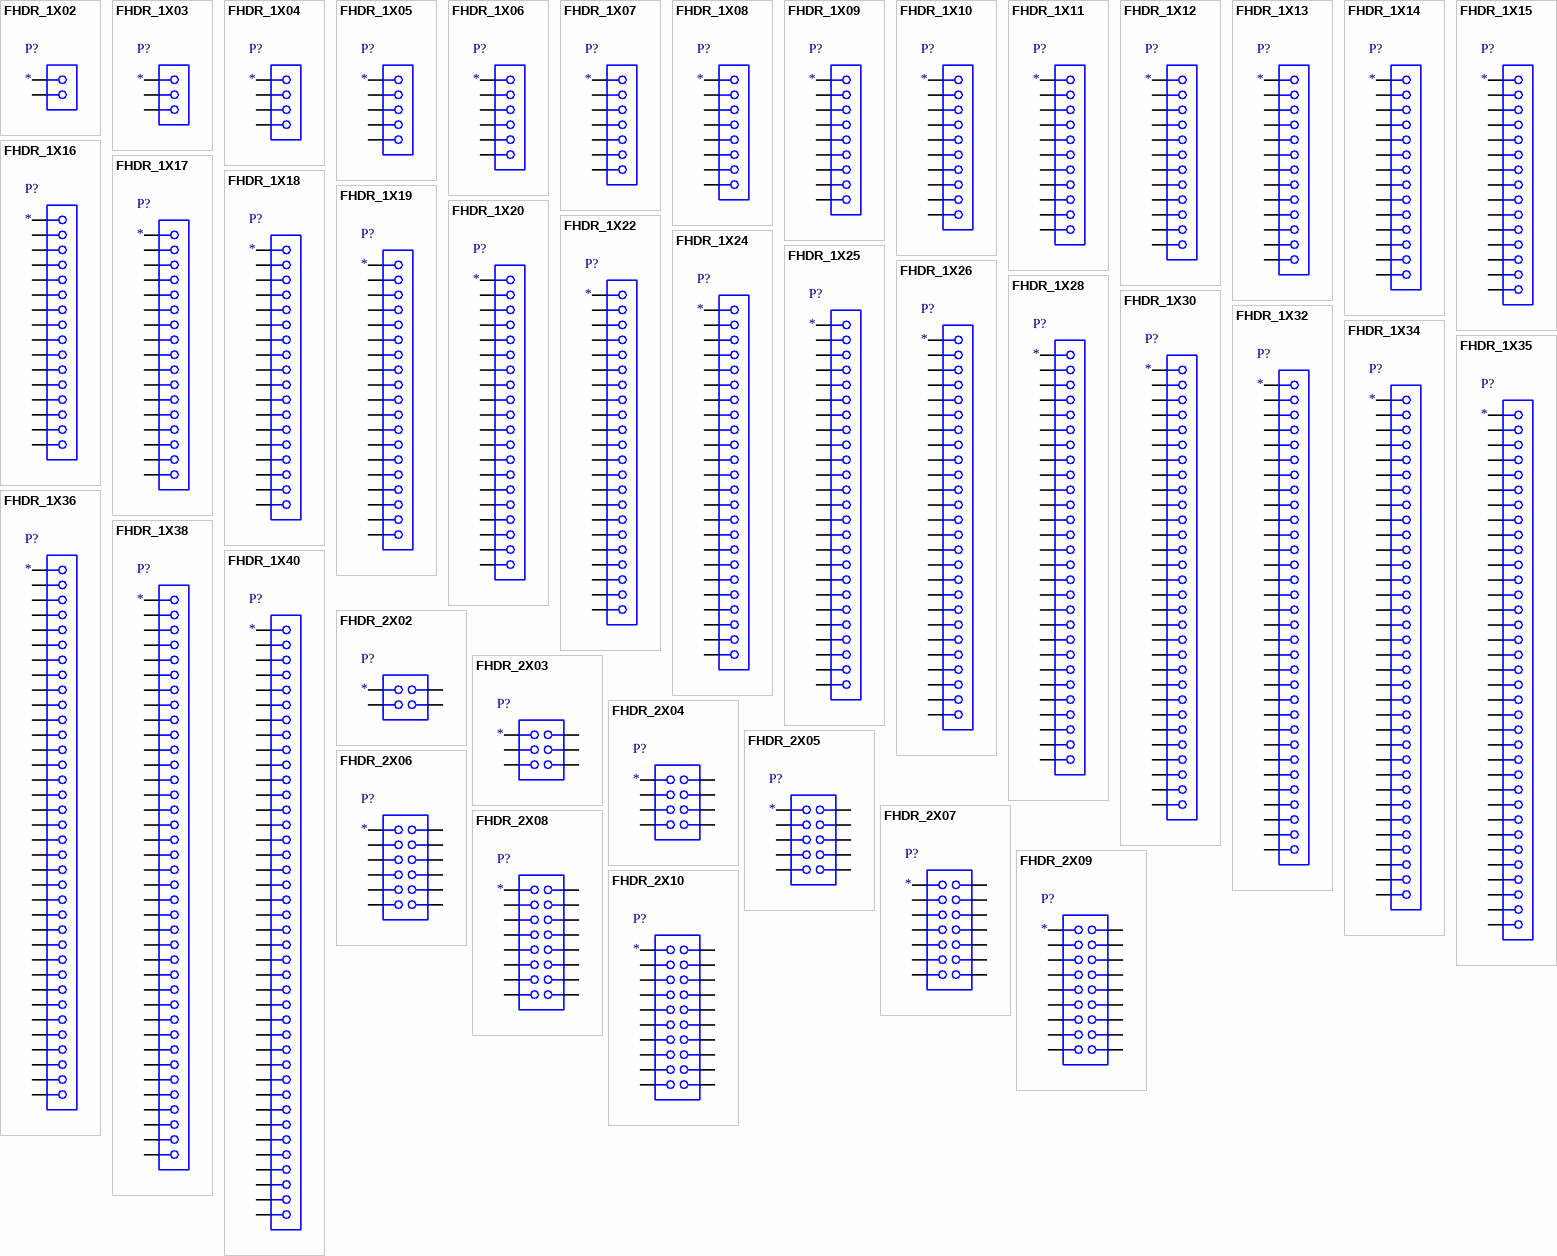
[diagram p2: symbols FHDR_1X02 to FHDR_2X10]

## FHDR_1X02
designator P?
Female Header 1X02
footprint FHDR1X02-254P (Female Header 1X02 with 2.54 mm Pitch)
pins: 1, 2
1 alternate drawing of the same symbol

## FHDR_1X03
designator P?
Female Header 1X03
footprint FHDR1X03-254P (Female Header 1X03 with 2.54 mm Pitch)
pins: 1, 2, 3
1 alternate drawing of the same symbol

## FHDR_1X04
designator P?
Female Header 1X04
footprint FHDR1X04-254P (Female Header 1X04 with 2.54 mm Pitch)
pins: 1, 2, 3, 4
1 alternate drawing of the same symbol

## FHDR_1X05
designator P?
Female Header 1X05
footprint FHDR1X05-254P (Female Header 1X05 with 2.54 mm Pitch)
pins: 1, 2, 3, 4, 5
1 alternate drawing of the same symbol

## FHDR_1X06
designator P?
Female Header 1X06
footprint FHDR1X06-254P (Female Header 1X06 with 2.54 mm Pitch)
pins: 1, 2, 3, 4, 5, 6
1 alternate drawing of the same symbol

## FHDR_1X07
designator P?
Female Header 1X07
footprint FHDR1X07-254P (Female Header 1X07 with 2.54 mm Pitch)
pins: 1, 2, 3, 4, 5, 6, 7
1 alternate drawing of the same symbol

## FHDR_1X08
designator P?
Female Header 1X08
footprint FHDR1X08-254P (Female Header 1X08 with 2.54 mm Pitch)
pins: 1, 2, 3, 4, 5, 6, 7, 8
1 alternate drawing of the same symbol

## FHDR_1X09
designator P?
Female Header 1X09
footprint FHDR1X09-254P (Female Header 1X09 with 2.54 mm Pitch)
pins: 1, 2, 3, 4, 5, 6, 7, 8, 9
1 alternate drawing of the same symbol

## FHDR_1X10
designator P?
Female Header 1X10
footprint FHDR1X10-254P (Female Header 1X10 with 2.54 mm Pitch)
pins: 1, 2, 3, 4, 5, 6, 7, 8, 9, 10
1 alternate drawing of the same symbol

## FHDR_1X11
designator P?
Female Header 1X11
footprint FHDR1X11-254P (Female Header 1X11 with 2.54 mm Pitch)
pins: 1, 2, 3, 4, 5, 6, 7, 8, 9, 10, 11
1 alternate drawing of the same symbol

## FHDR_1X12
designator P?
Female Header 1X12
footprint FHDR1X12-254P (Female Header 1X12 with 2.54 mm Pitch)
pins: 1, 2, 3, 4, 5, 6, 7, 8, 9, 10, 11, 12
1 alternate drawing of the same symbol

## FHDR_1X13
designator P?
Female Header 1X13
footprint FHDR1X13-254P (Female Header 1X13 with 2.54 mm Pitch)
pins: 1, 2, 3, 4, 5, 6, 7, 8, 9, 10, 11, 12, 13
1 alternate drawing of the same symbol

## FHDR_1X14
designator P?
Female Header 1X14
footprint FHDR1X14-254P (Female Header 1X14 with 2.54 mm Pitch)
pins: 1, 2, 3, 4, 5, 6, 7, 8, 9, 10, 11, 12, 13, 14
1 alternate drawing of the same symbol

## FHDR_1X15
designator P?
Female Header 1X15
footprint FHDR1X15-254P (Female Header 1X15 with 2.54 mm Pitch)
pins: 1, 2, 3, 4, 5, 6, 7, 8, 9, 10, 11, 12, 13, 14, 15
1 alternate drawing of the same symbol

## FHDR_1X16
designator P?
Female Header 1X16
footprint FHDR1X16-254P (Female Header 1X16 with 2.54 mm Pitch)
pins: 1, 2, 3, 4, 5, 6, 7, 8, 9, 10, 11, 12, 13, 14, 15, 16
1 alternate drawing of the same symbol
